# Altium footprint library KF.PcbLib: 31 footprints (part 2 of 2)
Each footprint in its own frame and in the unit in brackets; x right, y up, seen from the top. Pads: shape width x height; smd on the part's side, far side on the other; paste and mask are expansions set on the pad; w line width, h text height; cw(c..) or ccw(c..) is an arc to the next point about the centre after c.
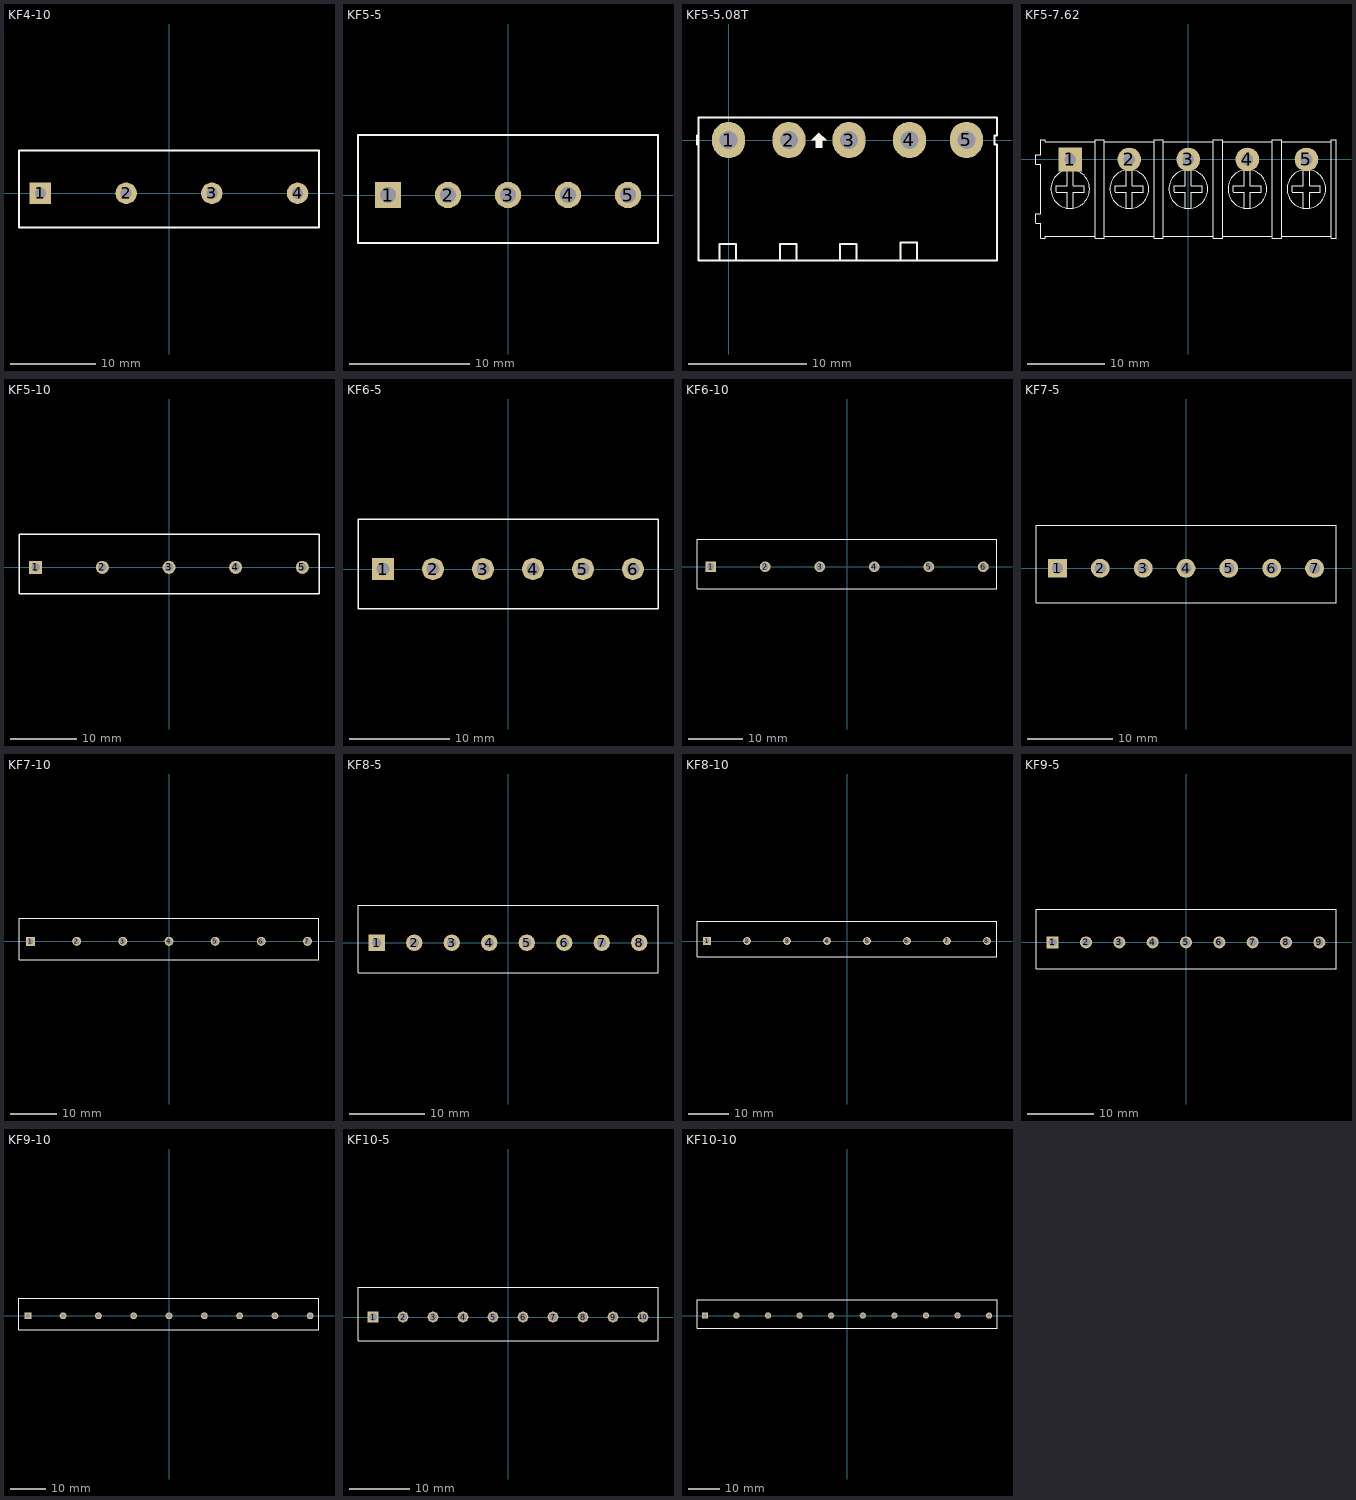
[diagram p1: the footprints below, top view; thin cyan lines are the x and y axes]

## KF4-10 [mm] "Serie 1368 - 10.00 mm _ 4 pins"
height 13
pads (4):
  rect 2.5x2.5 hole 1.3: 1(-15,0)
  round 2.5 hole 1.3: 2(-5,0) 3(5,0) 4(15,0)
Top Overlay:
  lines w0.2: -17.5,-4 17.5,-4 17.5,5 -17.5,5 -17.5,-4
3D body "691136810004.stp": height 13.1, standoff -3.9, extent -17.5,-4 17.5,5

## KF5-5 [mm] "Serie 1337 - 5.00 mm_5 pins"
height 13
pads (5):
  rect 2.2x2.2 hole 1.3: 1(-10,0)
  round 2.2 hole 1.3: 2(-5,0) 3(0,0) 4(5,0) 5(10,0)
Top Overlay:
  lines w0.127: -12.5,-4 -12.5,5 12.5,5 12.5,-4 -12.5,-4
3D body "691133710005.stp": height 13, standoff -3.6, extent -12.5,-4 12.5,5

## KF5-5.08T [mil]
pads (5):
  oval 110x120 hole 60: 1(0,0) 2(200,0) 3(400.06,0.06) 4(600.39,0.39) 5(789.39,0.39)
Top Overlay:
  region: 300,25 275,0 290,0 290,-25 310,-25 310,0 325,0
  lines w7: -105,-15 -105,15 ; -30,-400 -30,-345 25,-345 25,-400 ; 170,-400 170,-345 225,-345 225,-400 ; 370,-400 370,-345 425,-345 425,-400 ; 570,-395 570,-340 625,-340 625,-395 ; -100,-400 891,-400 891,-15 883,-15 883,15 891,15 891,75 -100,75 -100,-400
3D body "User Library-BigHeader 5EHDR_1P.step": height 158.08, standoff -332.91, extent 685,-401.22 881.85,71.22
3D body "User Library-BigHeader 5EHDR_1P.step": height 158.08, standoff -332.91, extent 490,-401.22 686.85,71.22
3D body "User Library-BigHeader 5EHDR_1P.step": height 158.08, standoff -332.91, extent 100,-401.22 296.85,71.22
3D body "User Library-BigHeader 5EHDR_1P.step": height 158.08, standoff -332.91, extent 295,-401.22 491.85,71.22
3D body "User Library-BigHeader 5EHDR_1P.step": height 158.08, standoff -332.91, extent -95,-402.44 101.85,70

## KF5-7.62 [mil]
pads (5):
  rect 120x120 hole 59.06 unplated: 1(-600,0)
  round 120 hole 59.06 unplated: 2(-300,0) 3(0,0) 4(300,0) 5(600,0)
Top Overlay:
  drawing of 152 lines, arcs and shapes, not listed
3D body "691313410005.stp": height 336.61, standoff -155.51, extent -750,-392.44 750,80

## KF5-10 [mm] "Serie 1368 - 10.00 mm _ 5 pins"
height 13
pads (5):
  rect 1.95x1.95 hole 1.3: 1(-20,0)
  round 1.95 hole 1.3: 2(-10,0) 3(0,0) 4(10,0) 5(20,0)
Top Overlay:
  lines w0.2: -22.5,-4 -22.5,5 22.5,5 22.5,-4 -22.5,-4
3D body "691136810005.stp": height 13.1, standoff -3.9, extent -22.5,-4 22.5,5

## KF6-5 [mm] "Serie 1337 - 5.00 mm_6 pins"
height 13
pads (6):
  rect 2.2x2.2 hole 1.3: 1(-12.5,0)
  round 2.2 hole 1.3: 2(-7.5,0) 3(-2.5,0) 4(2.5,0) 5(7.5,0) 6(12.5,0)
Top Overlay:
  lines w0.127: -15,-4 -15,5 15,5 15,-4 -15,-4
3D body "691133710006.stp": height 13, standoff -3.6, extent -15,-4 15,5

## KF6-10 [mm] "Serie 1368 - 10.00 mm _ 6 pins"
height 13
pads (6):
  rect 1.95x1.95 hole 1.3: 1(-25,0)
  round 1.95 hole 1.3: 2(-15,0) 3(-5,0) 4(5,0) 5(15,0) 6(25,0)
Top Overlay:
  lines w0.2: -27.5,-4 -27.5,5 27.5,5 27.5,-4 -27.5,-4
3D body "691136810006.stp": height 13.1, standoff -3.9, extent -27.5,-4 27.5,5

## KF7-5 [mm] "Serie 1337 - 5.00 mm_7 pins"
height 13
pads (7):
  rect 2.2x2.2 hole 1.3: 1(-15,0)
  round 2.2 hole 1.3: 2(-10,0) 3(-5,0) 4(0,0) 5(5,0) 6(10,0) 7(15,0)
Top Overlay:
  lines w0.127: -17.5,-4 -17.5,5 17.5,5 17.5,-4 -17.5,-4
3D body "691133710007.stp": height 13, standoff -3.6, extent -17.5,-4 17.5,5

## KF7-10 [mm] "Serie 1368 - 10.00 mm _ 7 pins"
height 13
pads (7):
  rect 1.95x1.95 hole 1.3: 1(-30,0)
  round 1.95 hole 1.3: 2(-20,0) 3(-10,0) 4(0,0) 5(10,0) 6(20,0) 7(30,0)
Top Overlay:
  lines w0.2: -32.5,-4 -32.5,5 32.5,5 32.5,-4 -32.5,-4
3D body "691136810007.stp": height 13.1, standoff -3.9, extent -32.5,-4 32.5,5

## KF8-5 [mm] "Serie 1337 - 5.00 mm_8 pins"
height 13
pads (8):
  rect 2.2x2.2 hole 1.3: 1(-17.5,0)
  round 2.2 hole 1.3: 2(-12.5,0) 3(-7.5,0) 4(-2.5,0) 5(2.5,0) 6(7.5,0) 7(12.5,0) 8(17.5,0)
Top Overlay:
  lines w0.127: -20,-4 20,-4 20,5 -20,5 -20,-4
3D body "691133710008.stp": height 13, standoff -3.6, extent -20,-4 20,5

## KF8-10 [mm] "Serie 1368 - 10.00 mm _ 8 pins"
height 13
pads (8):
  rect 1.95x1.95 hole 1.3: 1(-35,0)
  round 1.95 hole 1.3: 2(-25,0) 3(-15,0) 4(-5,0) 5(5,0) 6(15,0) 7(25,0) 8(35,0)
Top Overlay:
  lines w0.2: -37.5,-4 -37.5,5 37.5,5 37.5,-4 -37.5,-4
3D body "691136810008.stp": height 13.1, standoff -3.9, extent -37.5,-4 37.5,5

## KF9-5 [mm] "Serie 1337 - 5.00 mm_9 pins"
height 13
pads (9):
  rect 1.8x1.8 hole 1.3: 1(-20,0)
  round 1.8 hole 1.3: 2(-15,0) 3(-10,0) 4(-5,0) 5(0,0) 6(5,0) 7(10,0) 8(15,0) 9(20,0)
Top Overlay:
  lines w0.127: -22.5,-4 -22.5,5 22.5,5 22.5,-4 -22.5,-4
3D body "691133710009.stp": height 13, standoff -3.6, extent -22.5,-4 22.5,5

## KF9-10 [mm] "Serie 1368 - 10.00 mm _ 9 pins"
height 13
pads (9):
  rect 1.95x1.95 hole 1.3: 1(-40,0)
  round 1.95 hole 1.3: 2(-30,0) 3(-20,0) 4(-10,0) 5(0,0) 6(10,0) 7(20,0) 8(30,0) 9(40,0)
Top Overlay:
  lines w0.2: -42.5,-4 -42.5,5 42.5,5 42.5,-4 -42.5,-4
3D body "691136810009.stp": height 13.1, standoff -3.9, extent -42.5,-4 42.5,5

## KF10-5 [mm] "Serie 1337 - 5.00 mm_10 pins"
height 13
pads (10):
  rect 1.8x1.8 hole 1.3: 1(-22.5,0)
  round 1.8 hole 1.3: 2(-17.5,0) 3(-12.5,0) 4(-7.5,0) 5(-2.5,0) 6(2.5,0) 7(7.5,0) 8(12.5,0) 9(17.5,0) 10(22.5,0)
Top Overlay:
  lines w0.127: -25,-4 -25,5 25,5 25,-4 -25,-4
3D body "691133710010.stp": height 13, standoff -3.6, extent -25,-4 25,5

## KF10-10 [mm] "Serie 1368 - 10.00 mm _ 10 pins"
height 13
pads (10):
  rect 1.95x1.95 hole 1.3: 1(-45,0)
  round 1.95 hole 1.3: 2(-35,0) 3(-25,0) 4(-15,0) 5(-5,0) 6(5,0) 7(15,0) 8(25,0) 9(35,0) 10(45,0)
Top Overlay:
  lines w0.2: -47.5,-4 -47.5,5 47.5,5 47.5,-4 -47.5,-4
3D body "691136810010.stp": height 13.1, standoff -3.9, extent -47.5,-4 47.5,5